# Altium footprint library ICS.PcbLib: 74 footprints (part 3 of 5)
Each footprint in its own frame and in the unit in brackets; x right, y up, seen from the top. Pads: shape width x height; smd on the part's side, far side on the other; paste and mask are expansions set on the pad; w line width, h text height; cw(c..) or ccw(c..) is an arc to the next point about the centre after c.
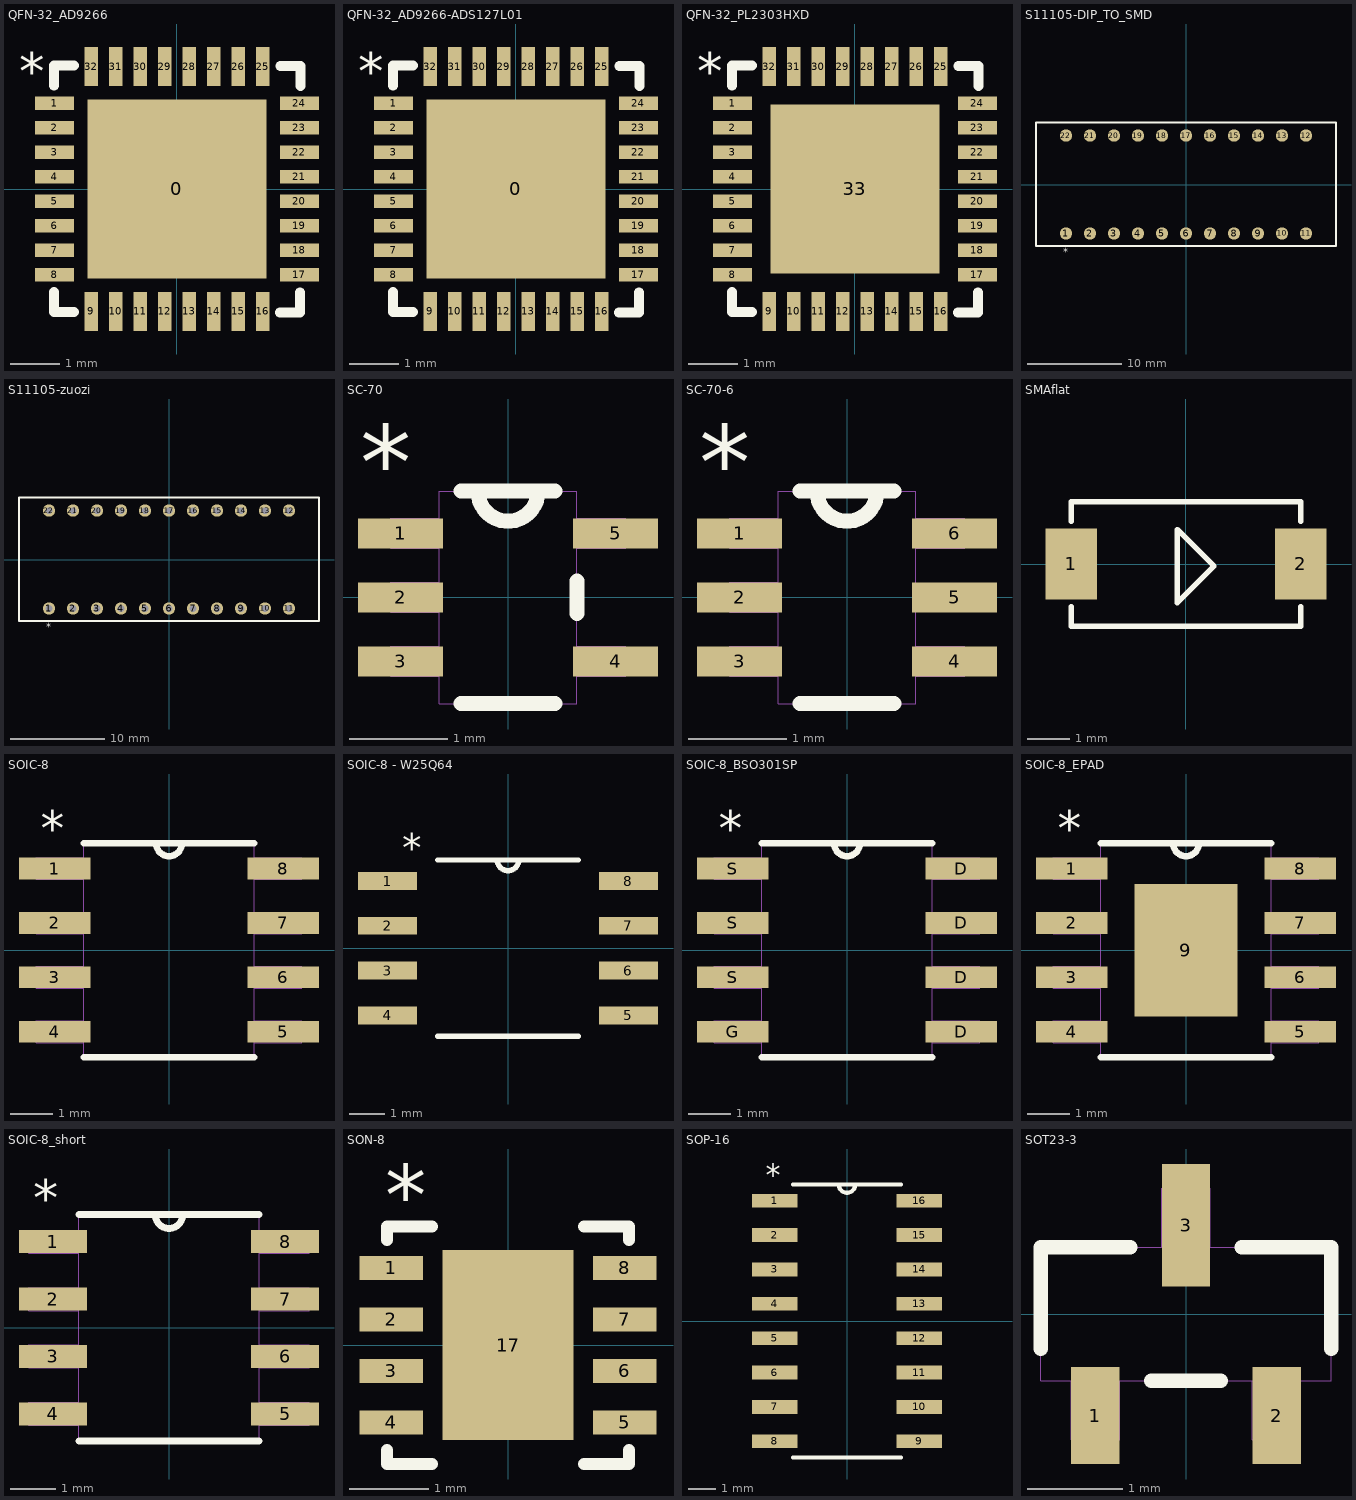
[diagram p2: the footprints below, top view; thin cyan lines are the x and y axes]

## QFN-32_AD9266 [mm]
pads (33):
  rect 3.65x3.65 smd paste-1.712 mask+0.051: 0(0,0)
  rect 0.8x0.27 smd paste+0 mask+0.051: 1(-2.5,1.75) 2(-2.5,1.25) 3(-2.5,0.75) 4(-2.5,0.25) 5(-2.5,-0.25) 6(-2.5,-0.75) 7(-2.5,-1.25) 8(-2.5,-1.75) 17(2.5,-1.75) 18(2.5,-1.25) 19(2.5,-0.75) 20(2.5,-0.25) 21(2.5,0.25) 22(2.5,0.75) 23(2.5,1.25) 24(2.5,1.75)
  rect 0.27x0.8 smd paste+0 mask+0.051: 9(-1.75,-2.5) 10(-1.25,-2.5) 11(-0.75,-2.5) 12(-0.25,-2.5) 13(0.25,-2.5) 14(0.75,-2.5) 15(1.25,-2.5) 16(1.75,-2.5) 25(1.75,2.5) 26(1.25,2.5) 27(0.75,2.5) 28(0.25,2.5) 29(-0.25,2.5) 30(-0.75,2.5) 31(-1.25,2.5) 32(-1.75,2.5)
Top Overlay:
  lines w0.2: -2.51,-2.1 -2.51,-2.51 -2.1,-2.51 ; -2.51,2.11 -2.51,2.52 -2.1,2.52 ; 2.1,-2.52 2.51,-2.52 2.51,-2.11 ; 2.11,2.51 2.52,2.51 2.52,2.1
  text "*" at -3.225,2.025 h0.76
Top Paste:
  region: 0.1,-0.1 0.1,-1.586 1.586,-1.586 1.586,-0.1
  region: -0.1,-1.586 -0.1,-0.1 -1.586,-0.1 -1.586,-1.586
  region: -0.1,0.1 -0.1,1.586 -1.586,1.586 -1.586,0.1
  region: 0.1,1.586 0.1,0.1 1.586,0.1 1.586,1.586
3D body: height 0.93, standoff 0, extent -2.51,-2.51 2.51,2.51

## QFN-32_AD9266-ADS127L01 [mm]
pads (33):
  rect 3.65x3.65 smd paste-1.712 mask+0.051: 0(0,0)
  rect 0.8x0.27 smd paste+0 mask+0.051: 1(-2.5,1.75) 2(-2.5,1.25) 3(-2.5,0.75) 4(-2.5,0.25) 5(-2.5,-0.25) 6(-2.5,-0.75) 7(-2.5,-1.25) 8(-2.5,-1.75) 17(2.5,-1.75) 18(2.5,-1.25) 19(2.5,-0.75) 20(2.5,-0.25) 21(2.5,0.25) 22(2.5,0.75) 23(2.5,1.25) 24(2.5,1.75)
  rect 0.27x0.8 smd paste+0 mask+0.051: 9(-1.75,-2.5) 10(-1.25,-2.5) 11(-0.75,-2.5) 12(-0.25,-2.5) 13(0.25,-2.5) 14(0.75,-2.5) 15(1.25,-2.5) 16(1.75,-2.5) 25(1.75,2.5) 26(1.25,2.5) 27(0.75,2.5) 28(0.25,2.5) 29(-0.25,2.5) 30(-0.75,2.5) 31(-1.25,2.5) 32(-1.75,2.5)
Top Overlay:
  lines w0.2: -2.51,-2.1 -2.51,-2.51 -2.1,-2.51 ; -2.51,2.11 -2.51,2.52 -2.1,2.52 ; 2.1,-2.52 2.51,-2.52 2.51,-2.11 ; 2.11,2.51 2.52,2.51 2.52,2.1
  text "*" at -3.225,2.025 h0.76
Top Paste:
  region: 0.1,1.586 0.1,0.1 1.586,0.1 1.586,1.586
  region: -0.1,0.1 -0.1,1.586 -1.586,1.586 -1.586,0.1
  region: -0.1,-1.586 -0.1,-0.1 -1.586,-0.1 -1.586,-1.586
  region: 0.1,-0.1 0.1,-1.586 1.586,-1.586 1.586,-0.1
3D body: height 0.93, standoff 0, extent -2.51,-2.51 2.51,2.51

## QFN-32_PL2303HXD [mm]
pads (33):
  rect 0.8x0.27 smd paste+0 mask+0.051: 1(-2.5,1.75) 2(-2.5,1.25) 3(-2.5,0.75) 4(-2.5,0.25) 5(-2.5,-0.25) 6(-2.5,-0.75) 7(-2.5,-1.25) 8(-2.5,-1.75) 17(2.5,-1.75) 18(2.5,-1.25) 19(2.5,-0.75) 20(2.5,-0.25) 21(2.5,0.25) 22(2.5,0.75) 23(2.5,1.25) 24(2.5,1.75)
  rect 0.27x0.8 smd paste+0 mask+0.051: 9(-1.75,-2.5) 10(-1.25,-2.5) 11(-0.75,-2.5) 12(-0.25,-2.5) 13(0.25,-2.5) 14(0.75,-2.5) 15(1.25,-2.5) 16(1.75,-2.5) 25(1.75,2.5) 26(1.25,2.5) 27(0.75,2.5) 28(0.25,2.5) 29(-0.25,2.5) 30(-0.75,2.5) 31(-1.25,2.5) 32(-1.75,2.5)
  rect 3.45x3.45 smd paste-1.712 mask+0.051: 33(0,0)
Top Overlay:
  lines w0.2: -2.51,-2.1 -2.51,-2.51 -2.1,-2.51 ; -2.51,2.11 -2.51,2.52 -2.1,2.52 ; 2.1,-2.52 2.51,-2.52 2.51,-2.11 ; 2.11,2.51 2.52,2.51 2.52,2.1
  text "*" at -3.225,2.025 h0.76
Top Paste:
  region: 0.1,-0.1 0.1,-1.586 1.586,-1.586 1.586,-0.1
  region: -0.1,-1.586 -0.1,-0.1 -1.586,-0.1 -1.586,-1.586
  region: -0.1,0.1 -0.1,1.586 -1.586,1.586 -1.586,0.1
  region: 0.1,1.586 0.1,0.1 1.586,0.1 1.586,1.586
3D body: height 0.93, standoff 0, extent -2.51,-2.51 2.51,2.51

## S11105-DIP_TO_SMD [mm]
pads (22):
  round 1.3 smd: 1(-12.7,-5.18) 2(-10.16,-5.18) 3(-7.62,-5.18) 4(-5.08,-5.18) 5(-2.54,-5.18) 6(0,-5.18) 7(2.54,-5.18) 8(5.08,-5.18) 9(7.62,-5.18) 10(10.16,-5.18) 11(12.7,-5.18) 12(12.7,5.18) 13(10.16,5.18) 14(7.62,5.18) 15(5.08,5.18) 16(2.54,5.18) 17(0,5.18) 18(-2.54,5.18) 19(-5.08,5.18) 20(-7.62,5.18) 21(-10.16,5.18) 22(-12.7,5.18)
Top Overlay:
  lines w0.2: -15.875,-6.5 -15.875,6.55 15.875,6.55 15.875,-6.5 -15.875,-6.5
  text "*" at -13,-7.5 h0.76
3D body: height 12.01, standoff 0.01, extent -15.875,-6.55 15.875,6.55

## S11105-zuozi [mm]
pads (22):
  round 1.3 hole 0.7: 1(-12.7,-5.18) 2(-10.16,-5.18) 3(-7.62,-5.18) 4(-5.08,-5.18) 5(-2.54,-5.18) 6(0,-5.18) 7(2.54,-5.18) 8(5.08,-5.18) 9(7.62,-5.18) 10(10.16,-5.18) 11(12.7,-5.18) 12(12.7,5.18) 13(10.16,5.18) 14(7.62,5.18) 15(5.08,5.18) 16(2.54,5.18) 17(0,5.18) 18(-2.54,5.18) 19(-5.08,5.18) 20(-7.62,5.18) 21(-10.16,5.18) 22(-12.7,5.18)
Top Overlay:
  lines w0.2: -15.875,-6.5 15.875,-6.5 15.875,6.55 -15.875,6.55 -15.875,-6.5
  text "*" at -13,-7.5 h0.76
3D body: height 9.01, standoff -2.99, extent -15.875,-6.55 15.875,6.55

## SC-70 [mil]
pads (5):
  rect 34x12 smd: 1(-43,25.59) 2(-43,0) 3(-43,-25.59) 4(43,-25.59) 5(43,25.59)
Top Overlay:
  lines w6: -18.75,-42.5 18.75,-42.5 ; -18.75,42.5 18.75,42.5 ; -12,42.5 ccw(c0,42.5) 12,42.5 ; 27.5,-6.49 27.5,6.49
  text "*" at -59.06,39.37 h30
Mechanical 1:
  lines w0: -12,42.5 ccw(c0,42.5) 12,42.5 ; -47,-31.59 -47,-19.59 -27.5,-19.59 -27.5,-31.59 -47,-31.59 ; -47,-6 -47,6 -27.5,6 -27.5,-6 -47,-6 ; -47,19.59 -47,31.59 -27.5,31.59 -27.5,19.59 -47,19.59 ; -27.5,-42.5 27.5,-42.5 27.5,42.5 -27.5,42.5 -27.5,-42.5 ; 27.5,-31.59 27.5,-19.59 47,-19.59 47,-31.59 27.5,-31.59 ; 27.5,19.59 27.5,31.59 47,31.59 47,19.59 27.5,19.59
3D body: height 37.81, standoff 0.6, extent -44.89,-39.36 44.88,39.38

## SC-70-6 [mil]
pads (6):
  rect 34x12 smd: 1(-43,25.59) 2(-43,0) 3(-43,-25.59) 4(43,-25.59) 5(43,0) 6(43,25.59)
Top Overlay:
  lines w6: -18.75,-42.5 18.75,-42.5 ; -18.75,42.5 18.75,42.5 ; -12,42.5 ccw(c0,42.5) 12,42.5
  text "*" at -59.06,39.37 h30
Mechanical 1:
  lines w0: -12,42.5 ccw(c0,42.5) 12,42.5 ; -47,-31.59 -47,-19.59 -27.5,-19.59 -27.5,-31.59 -47,-31.59 ; -47,-6 -47,6 -27.5,6 -27.5,-6 -47,-6 ; -47,19.59 -47,31.59 -27.5,31.59 -27.5,19.59 -47,19.59 ; -27.5,-42.5 27.5,-42.5 27.5,42.5 -27.5,42.5 -27.5,-42.5 ; 27.5,-31.59 27.5,-19.59 47,-19.59 47,-31.59 27.5,-31.59 ; 27.5,19.59 27.5,31.59 47,31.59 47,19.59 27.5,19.59
3D body: height 37.81, standoff 0.6, extent -44.89,-39.36 44.88,39.38

## SMAflat [mm] "smaflat"
pads (2):
  rect 1.2x1.65 smd: 1(-2.675,0) 2(2.675,0)
Top Overlay:
  lines w0.127: -2.675,-1 -2.675,-1.45 2.675,-1.45 2.675,-1 ; -2.675,1 -2.675,1.45 2.675,1.45 2.675,1 ; -0.2,0.775 -0.2,-0.9 0.65,-0.05 -0.2,0.8
3D body: height 2.52, standoff -0.08, extent -2.675,-1.45 2.675,1.45

## SOIC-8 [mil]
pads (8):
  rect 66x20 smd: 1(-105,75) 2(-105,25) 3(-105,-25) 4(-105,-75) 5(105,-75) 6(105,-25) 7(105,25) 8(105,75)
Top Overlay:
  lines w6: -78.5,-98.5 78.5,-98.5 ; -78.5,98.5 78.5,98.5 ; -12,98.5 ccw(c0,98.5) 12,98.5
  text "*" at -118.11,96.45 h32
Mechanical 1:
  lines w0: -12,98.5 ccw(c0,98.5) 12,98.5 ; -122,-85 -122,-65 -78.5,-65 -78.5,-85 -122,-85 ; -122,-35 -122,-15 -78.5,-15 -78.5,-35 -122,-35 ; -122,15 -122,35 -78.5,35 -78.5,15 -122,15 ; -122,65 -122,85 -78.5,85 -78.5,65 -122,65 ; -78.5,-98.5 78.5,-98.5 78.5,98.5 -78.5,98.5 -78.5,-98.5 ; 78.5,-85 78.5,-65 122,-65 122,-85 78.5,-85 ; 78.5,-35 78.5,-15 122,-15 122,-35 78.5,-35 ; 78.5,15 78.5,35 122,35 122,15 78.5,15 ; 78.5,65 78.5,85 122,85 122,65 78.5,65
3D body: height 64.19, standoff 0.6, extent -118.11,-96.47 118.11,96.45

## SOIC-8 - W25Q64 [mil]
pads (8):
  rect 66x20 smd: 1(-134.53,75) 2(-134.53,25) 3(-134.53,-25) 4(-134.53,-75) 5(134.53,-75) 6(134.53,-25) 7(134.53,25) 8(134.53,75)
Top Overlay:
  lines w6: -78.5,-98.5 78.5,-98.5 ; -78.5,98.5 78.5,98.5 ; -12,98.5 ccw(c0,98.5) 12,98.5
  text "*" at -118.11,96.45 h32
3D body: height 64.19, standoff 0.6, extent -118.11,-96.47 118.11,96.45

## SOIC-8_BSO301SP [mil]
pads (8):
  rect 66x20 smd: D(105,-75) D(105,-25) D(105,25) D(105,75) G(-105,-75) S(-105,-25) S(-105,25) S(-105,75)
Top Overlay:
  lines w6: -78.5,-98.5 78.5,-98.5 ; -78.5,98.5 78.5,98.5 ; -12,98.5 ccw(c0,98.5) 12,98.5
  text "*" at -118.11,96.45 h32
Mechanical 1:
  lines w0: -12,98.5 ccw(c0,98.5) 12,98.5 ; -122,-85 -78.5,-85 -78.5,-65 -122,-65 -122,-85 ; -122,-35 -78.5,-35 -78.5,-15 -122,-15 -122,-35 ; -122,15 -78.5,15 -78.5,35 -122,35 -122,15 ; -122,65 -78.5,65 -78.5,85 -122,85 -122,65 ; -78.5,-98.5 -78.5,98.5 78.5,98.5 78.5,-98.5 -78.5,-98.5 ; 78.5,-85 122,-85 122,-65 78.5,-65 78.5,-85 ; 78.5,-35 122,-35 122,-15 78.5,-15 78.5,-35 ; 78.5,15 122,15 122,35 78.5,35 78.5,15 ; 78.5,65 122,65 122,85 78.5,85 78.5,65
3D body: height 64.19, standoff 0.6, extent -118.11,-96.47 118.11,96.45

## SOIC-8_EPAD [mil]
pads (9):
  rect 66x20 smd: 1(-105,75) 2(-105,25) 3(-105,-25) 4(-105,-75) 5(105,-75) 6(105,-25) 7(105,25) 8(105,75)
  rect 94.49x122.05 smd: 9(0,-0.01)
Top Overlay:
  lines w6: -78.5,-98.5 78.5,-98.5 ; -78.5,98.5 78.5,98.5 ; -12,98.5 ccw(c0,98.5) 12,98.5
  text "*" at -118.11,96.45 h32
Mechanical 1:
  lines w0: -12,98.5 ccw(c0,98.5) 12,98.5 ; -122,-85 -122,-65 -78.5,-65 -78.5,-85 -122,-85 ; -122,-35 -122,-15 -78.5,-15 -78.5,-35 -122,-35 ; -122,15 -122,35 -78.5,35 -78.5,15 -122,15 ; -122,65 -122,85 -78.5,85 -78.5,65 -122,65 ; -78.5,-98.5 78.5,-98.5 78.5,98.5 -78.5,98.5 -78.5,-98.5 ; 78.5,-85 78.5,-65 122,-65 122,-85 78.5,-85 ; 78.5,-35 78.5,-15 122,-15 122,-35 78.5,-35 ; 78.5,15 78.5,35 122,35 122,15 78.5,15 ; 78.5,65 78.5,85 122,85 122,65 78.5,65
3D body: height 64.19, standoff 0.6, extent -118.11,-96.47 118.11,96.45

## SOIC-8_short [mm]
pads (8):
  rect 1.5x0.508 smd: 1(-2.567,1.905) 2(-2.567,0.635) 3(-2.567,-0.635) 4(-2.567,-1.905) 5(2.567,-1.905) 6(2.567,-0.635) 7(2.567,0.635) 8(2.567,1.905)
Top Overlay:
  lines w0.152: -1.994,-2.502 1.994,-2.502 ; -1.994,2.502 1.994,2.502 ; -0.305,2.502 ccw(c0,2.502) 0.305,2.502
  text "*" at -3,2.45 h0.81
Mechanical 1:
  lines w0: -0.305,2.502 ccw(c0,2.502) 0.305,2.502 ; -3.099,-2.159 -1.994,-2.159 -1.994,-1.651 -3.099,-1.651 -3.099,-2.159 ; -3.099,-0.889 -1.994,-0.889 -1.994,-0.381 -3.099,-0.381 -3.099,-0.889 ; -3.099,0.381 -1.994,0.381 -1.994,0.889 -3.099,0.889 -3.099,0.381 ; -3.099,1.651 -1.994,1.651 -1.994,2.159 -3.099,2.159 -3.099,1.651 ; -1.994,-2.502 -1.994,2.502 1.994,2.502 1.994,-2.502 -1.994,-2.502 ; 1.994,-2.159 3.099,-2.159 3.099,-1.651 1.994,-1.651 1.994,-2.159 ; 1.994,-0.889 3.099,-0.889 3.099,-0.381 1.994,-0.381 1.994,-0.889 ; 1.994,0.381 3.099,0.381 3.099,0.889 1.994,0.889 1.994,0.381 ; 1.994,1.651 3.099,1.651 3.099,2.159 1.994,2.159 1.994,1.651
3D body: height 1.63, standoff 0.02, extent -3,-2.45 3,2.45

## SON-8 [mm]
pads (9):
  rect 0.8x0.3 smd: 1(-1.475,0.975) 2(-1.475,0.325) 3(-1.475,-0.325) 4(-1.475,-0.975) 5(1.475,-0.975) 6(1.475,-0.325) 7(1.475,0.325) 8(1.475,0.975)
  rect 1.65x2.4 smd: 17(0,0)
Top Overlay:
  lines w0.152: -1.525,-1.325 -1.525,-1.5 -0.959,-1.5 ; -1.525,1.325 -1.525,1.5 -0.959,1.5 ; 0.959,-1.5 1.525,-1.5 1.525,-1.325 ; 0.959,1.5 1.525,1.5 1.525,1.325
  text "*" at -1.55,1.525 h0.76
3D body: height 0.79, standoff 0.02, extent -1.51,-1.5 1.51,1.5

## SOP-16 [mil]
pads (16):
  rect 66x20 smd: 1(-105,175) 2(-105,125) 3(-105,75) 4(-105,25) 5(-105,-25) 6(-105,-75) 7(-105,-125) 8(-105,-175) 9(105,-175) 10(105,-125) 11(105,-75) 12(105,-25) 13(105,25) 14(105,75) 15(105,125) 16(105,175)
Top Overlay:
  lines w6: -78.5,-198.5 78.5,-198.5 ; -78.5,198.5 78.5,198.5 ; -12,198.5 ccw(c0,198.5) 12,198.5
  text "*" at -118.11,196.45 h32
3D body: height 64.08, standoff 1.47, extent -117.99,-195 118.01,195

## SOT23-3 [mil]
pads (3):
  rect 20x40 smd: 1(-37.4,-41.94) 2(37.4,-41.94)
  rect 20x50.5 smd: 3(0,36.69)
Top Overlay:
  lines w6: -60,-14.41 -60,27.5 -23.1,27.5 ; -14.3,-27.5 14.3,-27.5 ; 23.1,27.5 60,27.5 60,-14.41
Mechanical 1:
  lines w0: -60,-27.5 -60,27.5 60,27.5 60,-27.5 -60,-27.5 ; -47.4,-52 -27.4,-52 -27.4,-27.5 -47.4,-27.5 -47.4,-52 ; -10,27.5 -10,52 10,52 10,27.5 -10,27.5 ; 27.4,-52 47.4,-52 47.4,-27.5 27.4,-27.5 27.4,-52
3D body: height 38.71, standoff 0.6, extent -57.49,-49.5 57.51,49.51